# Altium footprint library SG__PCB_Modules.PcbLib: 73 footprints (part 1 of 5)
Each footprint in its own frame and in the unit in brackets; x right, y up, seen from the top. Pads: shape width x height; smd on the part's side, far side on the other; paste and mask are expansions set on the pad; w line width, h text height; cw(c..) or ccw(c..) is an arc to the next point about the centre after c.
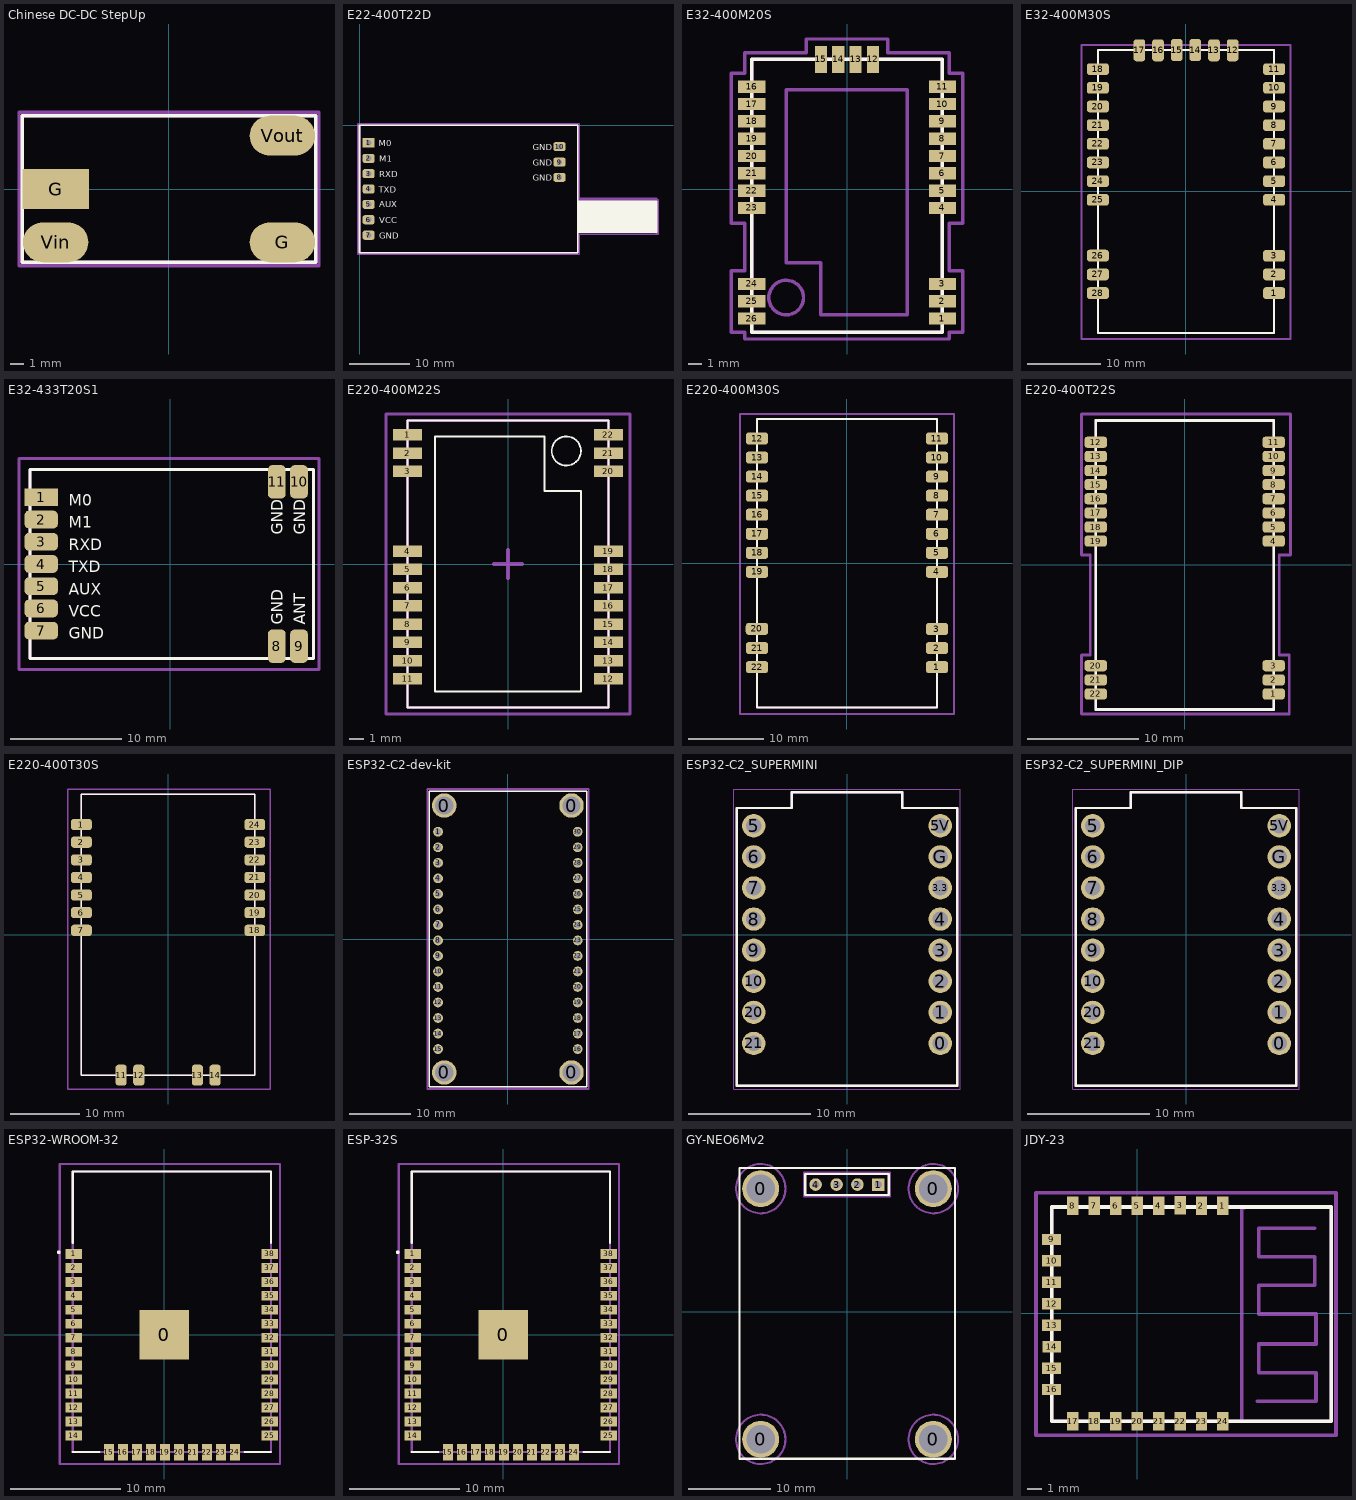
[diagram p0: the footprints below, top view; thin cyan lines are the x and y axes]

## Chinese DC-DC StepUp [mm]
pads (4):
  rect 5x3 smd: G(-8.5,0)
  oval 4.9x3 smd: G(8.5,-4) Vin(-8.5,-4) Vout(8.5,4)
Top Overlay:
  lines w0.254: -11,-5.5 -11,5.5 11,5.5 11,-5.5 -11,-5.5
Assembly Top:
  lines w0.254: -11,-5.5 11,-5.5 11,5.5 -11,5.5 -11,-5.5
Courtyard Top:
  lines w0.254: -11.25,-5.75 -11.25,5.75 11.25,5.75 11.25,-5.75 -11.25,-5.75
3D body: height 1.5, standoff 0, extent -11,-5.5 11,5.5

## E22-400T22D [mm]
pads (10):
  rect 2x1.5 hole 0.9: 1(1.5,-2.875)
  rrect50% 2x1.5 hole 0.9: 2(1.5,-5.45) 3(1.5,-7.975) 4(1.5,-10.5) 5(1.5,-13.025) 6(1.5,-15.575) 7(1.5,-18.125) 8(33,-8.575) 9(33,-6.05) 10(33,-3.5)
Top Overlay:
  rectangle: 36,-17.6 49,-12.5
  lines w0.254: 36,-17.6 37,-17.6 47,-17.6 49,-17.6 49,-12.5 37,-12.5 36,-12.5 ; 0,-21 36,-21 36,0 0,0 0,-21
  text "M0" at 3.179,-3.471 h1.02
  text "RXD" at 3.229,-8.546 h1.02
  text "TXD" at 3.179,-11.121 h1.02
  text "AUX" at 3.254,-13.471 h1.02
  text "M1" at 3.229,-6.021 h1.02
  text "VCC" at 3.279,-16.146 h1.02
  text "GND" at 3.254,-18.696 h1.02
  text "GND" at 28.554,-4.096 h1.02
  text "GND" at 28.579,-6.646 h1.02
  text "GND" at 28.579,-9.146 h1.02
Assembly Top:
  lines w0.254: 0,-21 36,-21 36,-18 49,-18 49,-12 36,-12 36,0 0,0 0,-21
Courtyard Top:
  lines w0.254: -0.25,-21.25 36.25,-21.25 36.25,-18 49.25,-18 49.25,-12.25 36.25,-12.25 36.25,0.25 -0.25,0.25 -0.25,-21.25
3D Body Top:
  rectangle: 36,-17.6 49,-12.5
  lines w0.254: 36,-17.6 37,-17.6 47,-17.6 49,-17.6 49,-12.5 37,-12.5 36,-12.5 ; 0,-21 36,-21 36,0 0,0 0,-21
3D body "PLS1.stp": height 8, standoff -3.54, extent 31.73,-9.85 34.27,-7.31
3D body "PLS1.stp": height 8, standoff -3.54, extent 31.73,-7.31 34.27,-4.77
3D body "PLS1.stp": height 8, standoff -3.54, extent 31.73,-4.77 34.27,-2.23
3D body "E32-433T20DT.stp": height 10.1, standoff -3.52, extent 0.15,-20.9 48.65,0.1

## E32-400M20S [mm]
pads (26):
  rect 2x0.9 smd: 1(6.995,-9.5) 2(6.995,-8.23) 3(6.995,-6.96) 4(6.995,-1.39) 5(6.995,-0.12) 6(6.995,1.15) 7(6.995,2.42) 8(6.995,3.69) 9(6.995,4.96) 10(6.995,6.23) 11(6.995,7.5) 16(-6.995,7.5) 17(-6.995,6.23) 18(-6.995,4.96) 19(-6.995,3.69) 20(-6.995,2.42) 21(-6.995,1.15) 22(-6.995,-0.12) 23(-6.995,-1.39) 24(-6.995,-6.96) 25(-6.995,-8.23) 26(-6.995,-9.5)
  rect 0.9x2 smd: 12(1.895,9.5) 13(0.625,9.5) 14(-0.645,9.5) 15(-1.915,9.5)
Top Overlay:
  lines w0.254: -7.005,-10.5 6.995,-10.5 6.995,9.5 -7.005,9.5 -7.005,-10.5
Assembly Top:
  circle w0.254: c-4.465,-7.96 r1.27
  lines w0.254: -7.005,-10.5 -7.005,9.5 6.995,9.5 6.995,-10.5 -7.005,-10.5 ; -4.465,-5.42 -4.465,7.28 4.425,7.28 4.425,-9.23 -1.925,-9.23 -1.925,-5.42 -4.465,-5.42
Courtyard Top:
  lines w0.254: -8.505,-10.5 -8.505,-6 -7.505,-6 -7.505,-2.5 -8.505,-2.5 -8.505,8.5 -7.505,8.5 -7.505,10 -3.005,10 -3.005,11 2.995,11 2.995,10 7.495,10 7.495,8.5 8.495,8.5 8.495,-2.5 7.495,-2.5 7.495,-6 8.495,-6 8.495,-10.5 7.495,-10.5 7.495,-11 -7.505,-11 -7.505,-10.5 -8.505,-10.5
3D body "E32-400M20S.stp": height 1.7, standoff -0.1, extent -7.105,-10.5 7.095,9.6

## E32-400M30S [mm]
pads (28):
  rrect50% 3x1.6 smd: 1(12,-13.84) 2(12,-11.3) 3(12,-8.76) 4(12,-1.14) 5(12,1.4) 6(12,3.94) 7(12,6.48) 8(12,9.02) 9(12,11.56) 10(12,14.1) 11(12,16.64) 18(-12,16.64) 19(-12,14.1) 20(-12,11.56) 21(-12,9.02) 22(-12,6.48) 23(-12,3.94) 24(-12,1.4) 25(-12,-1.14) 26(-12,-8.74) 27(-12,-11.3) 28(-12,-13.84)
  rrect50% 1.6x3 smd: 12(6.35,19.21) 13(3.81,19.21) 14(1.27,19.25) 15(-1.27,19.25) 16(-3.81,19.21) 17(-6.35,19.21)
Top Overlay:
  lines w0.254: -12,-19.25 12,-19.25 12,19.25 -12,19.25 -12,-19.25
Assembly Top:
  lines w0.254: -12,-19.25 12,-19.25 12,19.25 -12,19.25 -12,-19.25
Courtyard Top:
  lines w0.254: -14.25,-20.09 14.25,-20.09 14.25,19.91 -14.25,19.91 -14.25,-20.09
3D body "E32-400M30S.stp": height 3, standoff -0.1, extent -12.1,-19.25 12.1,19.35

## E32-433T20S1 [mm]
pads (11):
  rect 3x1.6 smd: 1(-11.6,6)
  rrect50% 3x1.6 smd: 2(-11.6,4) 3(-11.6,2) 4(-11.6,0) 5(-11.6,-2) 6(-11.6,-4) 7(-11.6,-6)
  rrect50% 1.6x3 smd: 8(9.6,-7.4) 9(11.6,-7.4) 10(11.6,7.4) 11(9.6,7.4)
Top Overlay:
  lines w0.254: -12.6,-8.5 -12.6,8.5 12.9,8.5 12.9,-8.5 -12.6,-8.5
  text "GND" at 10.146,2.654 h1.02
  text "GND" at 12.146,2.654 h1.02
  text "ANT" at 12.146,-5.446 h1.02
  text "GND" at 10.146,-5.446 h1.02
  text "GND" at -9.121,-6.746 h1.02
  text "VCC" at -9.121,-4.746 h1.02
  text "M1" at -9.121,3.254 h1.02
  text "AUX" at -9.121,-2.746 h1.02
  text "TXD" at -9.121,-0.746 h1.02
  text "RXD" at -9.121,1.254 h1.02
  text "M0" at -9.121,5.254 h1.02
Assembly Top:
  lines w0.254: -12.6,-8.5 -12.6,8.5 12.9,8.5 12.9,-8.5 -12.6,-8.5
Courtyard Top:
  lines w0.254: -13.6,-9.5 -13.6,9.5 13.4,9.5 13.4,-9.5 -13.6,-9.5
3D Body Top:
  lines w0.254: -12.6,-8.5 -12.6,8.5 12.9,8.5 12.9,-8.5 -12.6,-8.5
3D body "E32-433T20S1.stp": height 2.1, standoff 0, extent -12.75,-8.6 12.75,8.4

## E220-400M22S [mm]
pads (22):
  rect 2x0.8 smd: 1(-7,9) 2(-7,7.73) 3(-7,6.46) 4(-7,0.89) 5(-7,-0.38) 6(-7,-1.65) 7(-7,-2.92) 8(-7,-4.19) 9(-7,-5.46) 10(-7,-6.73) 11(-7,-8) 12(7,-8) 13(7,-6.73) 14(7,-5.46) 15(7,-4.19) 16(7,-2.92) 17(7,-1.65) 18(7,-0.38) 19(7,0.89) 20(7,6.46) 21(7,7.73) 22(7,9)
Top Overlay:
  circle w0.127: c4.064,7.874 r1.016
  lines w0.127: -7,-10 -7,10 7,10 7,-10 -7,-10 ; -5.08,-8.89 -5.08,8.89 2.54,8.89 2.54,5.08 5.08,5.08 5.08,-8.89 -5.08,-8.89
Assembly Top:
  lines w0.2: -7,-10 7,-10 7,10 -7,10 -7,-10
Courtyard Top:
  lines w0.2: -8.5,-10.45 8.5,-10.45 8.5,10.45 -8.5,10.45 -8.5,-10.45
  lines w0.254: -1,0 1,0 ; 0,-1 0,1
3D body "step_temp.STEP": height 3.1, standoff 0, extent -7,-10 7,10

## E220-400M30S [mm]
pads (22):
  rrect50% 3x1.6 smd: 1(12,-13.84) 2(12,-11.3) 3(12,-8.76) 4(12,-1.14) 5(12,1.4) 6(12,3.94) 7(12,6.48) 8(12,9.02) 9(12,11.56) 10(12,14.1) 11(12,16.64) 12(-12,16.64) 13(-12,14.1) 14(-12,11.56) 15(-12,9.02) 16(-12,6.48) 17(-12,3.94) 18(-12,1.4) 19(-12,-1.14) 20(-12,-8.74) 21(-12,-11.3) 22(-12,-13.84)
Top Overlay:
  lines w0.254: -12,-19.25 12,-19.25 12,19.25 -12,19.25 -12,-19.25
Assembly Top:
  lines w0.254: -12,-19.25 12,-19.25 12,19.25 -12,19.25 -12,-19.25
Courtyard Top:
  lines w0.254: -14.25,-20.09 14.25,-20.09 14.25,19.91 -14.25,19.91 -14.25,-20.09
3D body "E220-400M30S.stp": height 3.1, standoff 0, extent -12.1,-19.34 12.1,19.16

## E220-400T22S [mm]
pads (22):
  rrect50% 2x1 smd: 1(8,-11.6) 2(8,-10.33) 3(8,-9.06) 4(8,2.14) 5(8,3.41) 6(8,4.68) 7(8,5.95) 8(8,7.22) 9(8,8.49) 10(8,9.76) 11(8,11.03) 12(-8,11.03) 13(-8,9.76) 14(-8,8.49) 15(-8,7.22) 16(-8,5.95) 17(-8,4.68) 18(-8,3.41) 19(-8,2.14) 20(-8,-9.06) 21(-8,-10.33) 22(-8,-11.6)
Top Overlay:
  lines w0.254: -8,-13 8,-13 8,13 -8,13 -8,-13
Assembly Top:
  lines w0.254: 8,13 8,-13 -8,-13 -8,13 8,13 ; 8,13 8,13
Courtyard Top:
  lines w0.254: -9.27,-13.4 -9.27,-8.1 -8.5,-8.1 -8.5,0.9 -9.27,0.9 -9.27,13.57 9.4,13.57 9.5,13.57 9.5,0.9 8.5,0.9 8.5,-8.1 9.4,-8.1 9.4,-13.4 -9.27,-13.4
3D body "E220-400T22S.stp": height 3, standoff 0, extent -8,-13 8,13

## E220-400T30S [mm]
pads (18):
  rrect50% 3x1.6 smd: 1(-12.5,15.87) 2(-12.5,13.33) 3(-12.5,10.79) 4(-12.5,8.25) 5(-12.5,5.71) 6(-12.5,3.17) 7(-12.5,0.63) 18(12.5,0.63) 19(12.5,3.17) 20(12.5,5.71) 21(12.5,8.25) 22(12.5,10.79) 23(12.5,13.33) 24(12.5,15.87)
  rrect50% 1.6x3 smd: 11(-6.77,-20.25) 12(-4.23,-20.25) 13(4.23,-20.25) 14(6.77,-20.25)
Top Overlay:
  lines w0.2: -12.5,-20.25 12.5,-20.25 12.5,20.25 -12.5,20.25 -12.5,-20.25
Assembly Top:
  lines w0.2: -12.5,-20.25 -12.5,20.25 12.5,20.25 12.5,-20.25 -12.5,-20.25
Courtyard Top:
  lines w0.2: -14.5,-22.25 -14.5,21 14.75,21 14.75,-22.25 -14.5,-22.25
3D body "E220-400T30S.stp": height 2.1, standoff -0.1, extent -12.5,-20.35 12.713,20.25

## ESP32-C2-dev-kit [mm]
pads (34):
  round 4 hole 3: 0(-10.415,-21.845) 0(-10.415,21.845) 0(10.415,-21.845) 0(10.415,21.845)
  round 1.6 hole 1: 1(-11.43,17.55) 2(-11.43,15.01) 3(-11.43,12.47) 4(-11.43,9.93) 5(-11.43,7.39) 6(-11.43,4.85) 7(-11.43,2.31) 8(-11.43,-0.23) 9(-11.43,-2.77) 10(-11.43,-5.31) 11(-11.43,-7.85) 12(-11.43,-10.39) 13(-11.43,-12.93) 14(-11.43,-15.47) 15(-11.43,-18.01) 16(11.43,-18.01) 17(11.43,-15.47) 18(11.43,-12.93) 19(11.43,-10.39) 20(11.43,-7.85) 21(11.43,-5.31) 22(11.43,-2.77) 23(11.43,-0.23) 24(11.43,2.31) 25(11.43,4.85) 26(11.43,7.39) 27(11.43,9.93) 28(11.43,12.47) 29(11.43,15.01) 30(11.43,17.55)
Top Overlay:
  lines w0.254: -12.9,-24.2 12.9,-24.2 12.9,24.2 -12.9,24.2 -12.9,-24.2
Assembly Top:
  lines w0.254: -12.9,-24.2 12.9,-24.2 12.9,24.2 -12.9,24.2 -12.9,-24.2
Courtyard Top:
  lines w0.254: -13.23,-24.55 13.27,-24.55 13.27,24.55 -13.23,24.55 -13.23,-24.55
3D body "+++ ESP8266 NodeMCU Board +++.stp": height 9.53, standoff -2.9, extent -12.908,-24.403 12.782,24.082

## ESP32-C2_SUPERMINI [mm]
height 4.2
pads (16):
  round 1.905 hole 1.27: 0(7.62,-8.89) 1(7.62,-6.35) 2(7.62,-3.81) 3(7.62,-1.27) 3.3(7.62,3.81) 4(7.62,1.27) 5(-7.62,8.89) 5V(7.62,8.89) 6(-7.62,6.35) 7(-7.62,3.81) 8(-7.62,1.27) 9(-7.62,-1.27) 10(-7.62,-3.81) 20(-7.62,-6.35) 21(-7.62,-8.89) G(7.62,6.35)
Top Overlay:
  lines w0.2: -9,-12.36 -9,10.34 -4.5,10.34 -4.5,11.64 4.5,11.64 4.5,10.34 9,10.34 9,-12.36 -9,-12.36
Assembly Top:
  lines w0.2: -9,-12.36 9,-12.36 9,10.34 4.5,10.34 4.5,11.64 -4.5,11.64 -4.5,10.34 -9,10.34 -9,-12.36
Courtyard Top:
  lines w0.1: -9.25,-12.61 9.25,-12.61 9.25,11.89 -9.25,11.89 -9.25,-12.61
3D body "step_temp.STEP": height 4.16, standoff 0, extent -9,-12.36 9,11.64

## ESP32-C2_SUPERMINI_DIP [mm]
height 4.2
pads (16):
  round 1.905 hole 1.27: 0(7.62,-8.89) 1(7.62,-6.35) 2(7.62,-3.81) 3(7.62,-1.27) 3.3(7.62,3.81) 4(7.62,1.27) 5(-7.62,8.89) 5V(7.62,8.89) 6(-7.62,6.35) 7(-7.62,3.81) 8(-7.62,1.27) 9(-7.62,-1.27) 10(-7.62,-3.81) 20(-7.62,-6.35) 21(-7.62,-8.89) G(7.62,6.35)
Top Overlay:
  lines w0.2: -9,-12.36 9,-12.36 9,10.34 4.5,10.34 4.5,11.64 -4.5,11.64 -4.5,10.34 -9,10.34 -9,-12.36
Assembly Top:
  lines w0.2: -9,-12.36 -9,10.34 -4.5,10.34 -4.5,11.64 4.5,11.64 4.5,10.34 9,10.34 9,-12.36 -9,-12.36
Courtyard Top:
  lines w0.1: -9.25,-12.61 -9.25,11.89 9.25,11.89 9.25,-12.61 -9.25,-12.61
3D body "step_temp.STEP": height 16.16, standoff 12, extent -9,-12.36 9,11.64
3D body "PBS1-2.54.stp": height 8.5, standoff -3.15, extent -8.89,-7.62 -6.35,-5.08
3D body "PBS1-2.54.stp": height 8.5, standoff -3.15, extent -8.89,-10.16 -6.35,-7.62
3D body "PBS1-2.54.stp": height 8.5, standoff -3.15, extent -8.89,7.62 -6.35,10.16
3D body "PBS1-2.54.stp": height 8.5, standoff -3.15, extent -8.89,5.08 -6.35,7.62
3D body "PBS1-2.54.stp": height 8.5, standoff -3.15, extent -8.89,2.54 -6.35,5.08
3D body "PBS1-2.54.stp": height 8.5, standoff -3.15, extent -8.89,0 -6.35,2.54
3D body "PBS1-2.54.stp": height 8.5, standoff -3.15, extent -8.89,-2.54 -6.35,0
3D body "PBS1-2.54.stp": height 8.5, standoff -3.15, extent -8.89,-5.08 -6.35,-2.54
3D body "PBS1-2.54.stp": height 8.5, standoff -3.15, extent 6.35,-7.62 8.89,-5.08
3D body "PBS1-2.54.stp": height 8.5, standoff -3.15, extent 6.35,-10.16 8.89,-7.62
3D body "PBS1-2.54.stp": height 8.5, standoff -3.15, extent 6.35,7.62 8.89,10.16
3D body "PBS1-2.54.stp": height 8.5, standoff -3.15, extent 6.35,5.08 8.89,7.62
3D body "PBS1-2.54.stp": height 8.5, standoff -3.15, extent 6.35,2.54 8.89,5.08
3D body "PBS1-2.54.stp": height 8.5, standoff -3.15, extent 6.35,0 8.89,2.54
3D body "PBS1-2.54.stp": height 8.5, standoff -3.15, extent 6.35,-2.54 8.89,0
3D body "PBS1-2.54.stp": height 8.5, standoff -3.15, extent 6.35,-5.08 8.89,-2.54
3D body "PLS1.stp": height 14.5, standoff 2.96, extent 6.43,-7.62 8.97,-5.08
3D body "PLS1.stp": height 14.5, standoff 2.96, extent 6.43,2.54 8.97,5.08
3D body "PLS1.stp": height 14.5, standoff 2.96, extent 6.43,0 8.97,2.54
3D body "PLS1.stp": height 14.5, standoff 2.96, extent 6.43,-2.54 8.97,0
3D body "PLS1.stp": height 14.5, standoff 2.96, extent 6.43,-5.08 8.97,-2.54
3D body "PLS1.stp": height 14.5, standoff 2.96, extent 6.43,5.08 8.97,7.62
3D body "PLS1.stp": height 14.5, standoff 2.96, extent 6.43,7.62 8.97,10.16
3D body "PLS1.stp": height 14.5, standoff 2.96, extent 6.43,-10.16 8.97,-7.62
3D body "PLS1.stp": height 14.5, standoff 2.96, extent -8.81,-7.62 -6.27,-5.08
3D body "PLS1.stp": height 14.5, standoff 2.96, extent -8.81,2.54 -6.27,5.08
3D body "PLS1.stp": height 14.5, standoff 2.96, extent -8.81,0 -6.27,2.54
3D body "PLS1.stp": height 14.5, standoff 2.96, extent -8.81,-2.54 -6.27,0
3D body "PLS1.stp": height 14.5, standoff 2.96, extent -8.81,-5.08 -6.27,-2.54
3D body "PLS1.stp": height 14.5, standoff 2.96, extent -8.81,5.08 -6.27,7.62
3D body "PLS1.stp": height 14.5, standoff 2.96, extent -8.81,7.62 -6.27,10.16
3D body "PLS1.stp": height 14.5, standoff 2.96, extent -8.81,-10.16 -6.27,-7.62

## ESP32-WROOM-32 [mm]
pads (39):
  rect 4.5x4.5 smd: 0(0,0)
  rect 1.5x0.9 smd: 1(-8.22,7.34) 2(-8.22,6.07) 3(-8.22,4.8) 4(-8.22,3.53) 5(-8.22,2.26) 6(-8.22,0.99) 7(-8.22,-0.28) 8(-8.22,-1.55) 9(-8.22,-2.82) 10(-8.22,-4.09) 11(-8.22,-5.36) 12(-8.22,-6.63) 13(-8.22,-7.9) 14(-8.22,-9.17) 25(9.58,-9.17) 26(9.58,-7.9) 27(9.58,-6.63) 28(9.58,-5.36) 29(9.58,-4.09) 30(9.58,-2.82) 31(9.58,-1.55) 32(9.58,-0.28) 33(9.58,0.99) 34(9.58,2.26) 35(9.58,3.53) 36(9.58,4.8) 37(9.58,6.07) 38(9.58,7.34)
  rect 0.9x1.5 smd: 15(-5.03,-10.67) 16(-3.76,-10.67) 17(-2.49,-10.67) 18(-1.22,-10.67) 19(0.05,-10.67) 20(1.32,-10.67) 21(2.59,-10.67) 22(3.86,-10.67) 23(5.13,-10.67) 24(6.4,-10.67)
Top Overlay:
  circle w0.2: c-9.598,7.485 r0.061
  lines w0.2: -8.32,-10.67 -5.916,-10.67 ; -8.32,8.328 -8.32,14.83 9.68,14.83 9.68,8.328 ; 7.276,-10.67 9.68,-10.67
Assembly Top:
  lines w0.2: -8.32,-10.67 -8.32,14.83 9.68,14.83 9.68,-10.67 -8.32,-10.67
Courtyard Top:
  lines w0.2: -9.5,-11.75 -9.5,15.5 10.5,15.5 10.5,-11.75 -9.5,-11.75
3D body "User Library-ESP32-WROOM-32E-1.step": height 3.15, standoff -0.02, extent -8.268,-10.67 9.768,14.848

## ESP-32S [mm]
pads (39):
  rect 4.5x4.5 smd: 0(0,0)
  rect 1.5x0.9 smd: 1(-8.22,7.34) 2(-8.22,6.07) 3(-8.22,4.8) 4(-8.22,3.53) 5(-8.22,2.26) 6(-8.22,0.99) 7(-8.22,-0.28) 8(-8.22,-1.55) 9(-8.22,-2.82) 10(-8.22,-4.09) 11(-8.22,-5.36) 12(-8.22,-6.63) 13(-8.22,-7.9) 14(-8.22,-9.17) 25(9.58,-9.17) 26(9.58,-7.9) 27(9.58,-6.63) 28(9.58,-5.36) 29(9.58,-4.09) 30(9.58,-2.82) 31(9.58,-1.55) 32(9.58,-0.28) 33(9.58,0.99) 34(9.58,2.26) 35(9.58,3.53) 36(9.58,4.8) 37(9.58,6.07) 38(9.58,7.34)
  rect 0.9x1.5 smd: 15(-5.03,-10.67) 16(-3.76,-10.67) 17(-2.49,-10.67) 18(-1.22,-10.67) 19(0.05,-10.67) 20(1.32,-10.67) 21(2.59,-10.67) 22(3.86,-10.67) 23(5.13,-10.67) 24(6.4,-10.67)
Top Overlay:
  circle w0.2: c-9.598,7.485 r0.061
  lines w0.2: -8.32,-10.67 -5.916,-10.67 ; -8.32,8.328 -8.32,14.83 9.68,14.83 9.68,8.328 ; 7.276,-10.67 9.68,-10.67
Assembly Top:
  lines w0.2: -8.32,-10.67 -8.32,14.83 9.68,14.83 9.68,-10.67 -8.32,-10.67
Courtyard Top:
  lines w0.2: -9.5,-11.75 10.5,-11.75 10.5,15.5 -9.5,15.5 -9.5,-11.75
3D body "ESP32_S.SLDPRT": height 3.2, standoff -0.05, extent -8.32,-10.72 9.68,14.78

## GY-NEO6Mv2 [mm] "Ublox NEO6m Module PCB"
pads (8):
  round 4.5 hole 3.5: 0(-10.5,-15.5) 0(-10.5,15) 0(10.5,-15.5) 0(10.5,15)
  rect 1.524x1.524 hole 0.9: 1(3.81,15.5)
  round 1.524 hole 0.9: 2(1.27,15.5) 3(-1.27,15.5) 4(-3.81,15.5)
Top Overlay:
  lines w0.254: -13.072,-17.859 -13.072,17.5 13.128,17.5 13.128,-17.859 -13.072,-17.859 ; -5.08,14.23 -5.08,16.77 5.08,16.77 5.08,14.23 -5.08,14.23
Assembly Top:
  circle w0.254: c-10.5,-15.5 r3
  circle w0.254: c10.5,-15.5 r3
  circle w0.254: c10.5,15 r3
  circle w0.254: c-10.5,15 r3
  lines w0.2: -5.25,14 5.25,14 5.25,17 -5.25,17 -5.25,14
Assembly Bottom:
  circle w0.254: c-10.5,15 r3
  circle w0.254: c10.5,15 r3
  circle w0.254: c10.5,-15.5 r3
  circle w0.254: c-10.5,-15.5 r3
3D body "User Library-GY-GPS6MV2-1.step": height 6.5, standoff 3, extent -13.072,-17.858 13.128,17.542
3D body "PLS1.stp": height 8.54, standoff -3, extent -5.08,14.23 -2.54,16.77
3D body "PLS1.stp": height 8.54, standoff -3, extent -2.54,14.23 0,16.77
3D body "PLS1.stp": height 8.54, standoff -3, extent 0,14.23 2.54,16.77
3D body "PLS1.stp": height 8.54, standoff -3, extent 2.54,14.23 5.08,16.77

## JDY-23 [mm]
pads (24):
  rect 0.8x1.3 smd: 1(5.999,7.543) 2(4.499,7.543) 3(3.019,7.557) 4(1.499,7.543) 5(-0.001,7.543) 6(-1.501,7.543) 7(-3.001,7.543) 8(-4.501,7.543) 17(-4.501,-7.557) 18(-3.001,-7.557) 19(-1.501,-7.557) 20(-0.001,-7.557) 21(1.499,-7.557) 22(3.019,-7.543) 23(4.499,-7.557) 24(5.999,-7.557)
  rect 1.3x0.8 smd: 9(-5.999,5.173) 10(-5.999,3.673) 11(-5.999,2.173) 12(-5.999,0.673) 13(-5.999,-0.827) 14(-5.985,-2.347) 15(-5.999,-3.827) 16(-5.999,-5.327)
Top Overlay:
  lines w0.254: -5.985,7.397 -5.985,-7.543 ; -5.985,-7.543 -5.985,7.443 13.573,7.443 13.573,-7.543 -5.985,-7.543
Assembly Top:
  lines w0.254: -5.985,7.397 -5.985,-7.543 13.573,-7.543 13.573,7.463 -5.973,7.463 ; 7.315,-7.543 7.315,7.397 7.515,7.397 ; 8.415,-6.143 12.515,-6.143 12.515,-4.143 8.515,-4.143 8.515,-2.143 12.515,-2.143 12.515,-0.043 8.515,-0.043 8.515,1.957 12.415,1.957 12.415,3.957 8.515,3.957 8.515,5.957 12.415,5.957
Courtyard Top:
  lines w0.254: -7.085,-8.543 13.915,-8.543 13.915,8.457 -7.085,8.457 -7.085,-8.543
3D body "JDY-08.stp": height 2.08, standoff 0, extent -5.973,-7.549 13.915,7.463